# Altium footprint library IC.PCBLIB: 359 footprints (part 18 of 23)
Each footprint in its own frame and in the unit in brackets; x right, y up, seen from the top. Pads: shape width x height; smd on the part's side, far side on the other; paste and mask are expansions set on the pad; w line width, h text height; cw(c..) or ccw(c..) is an arc to the next point about the centre after c.
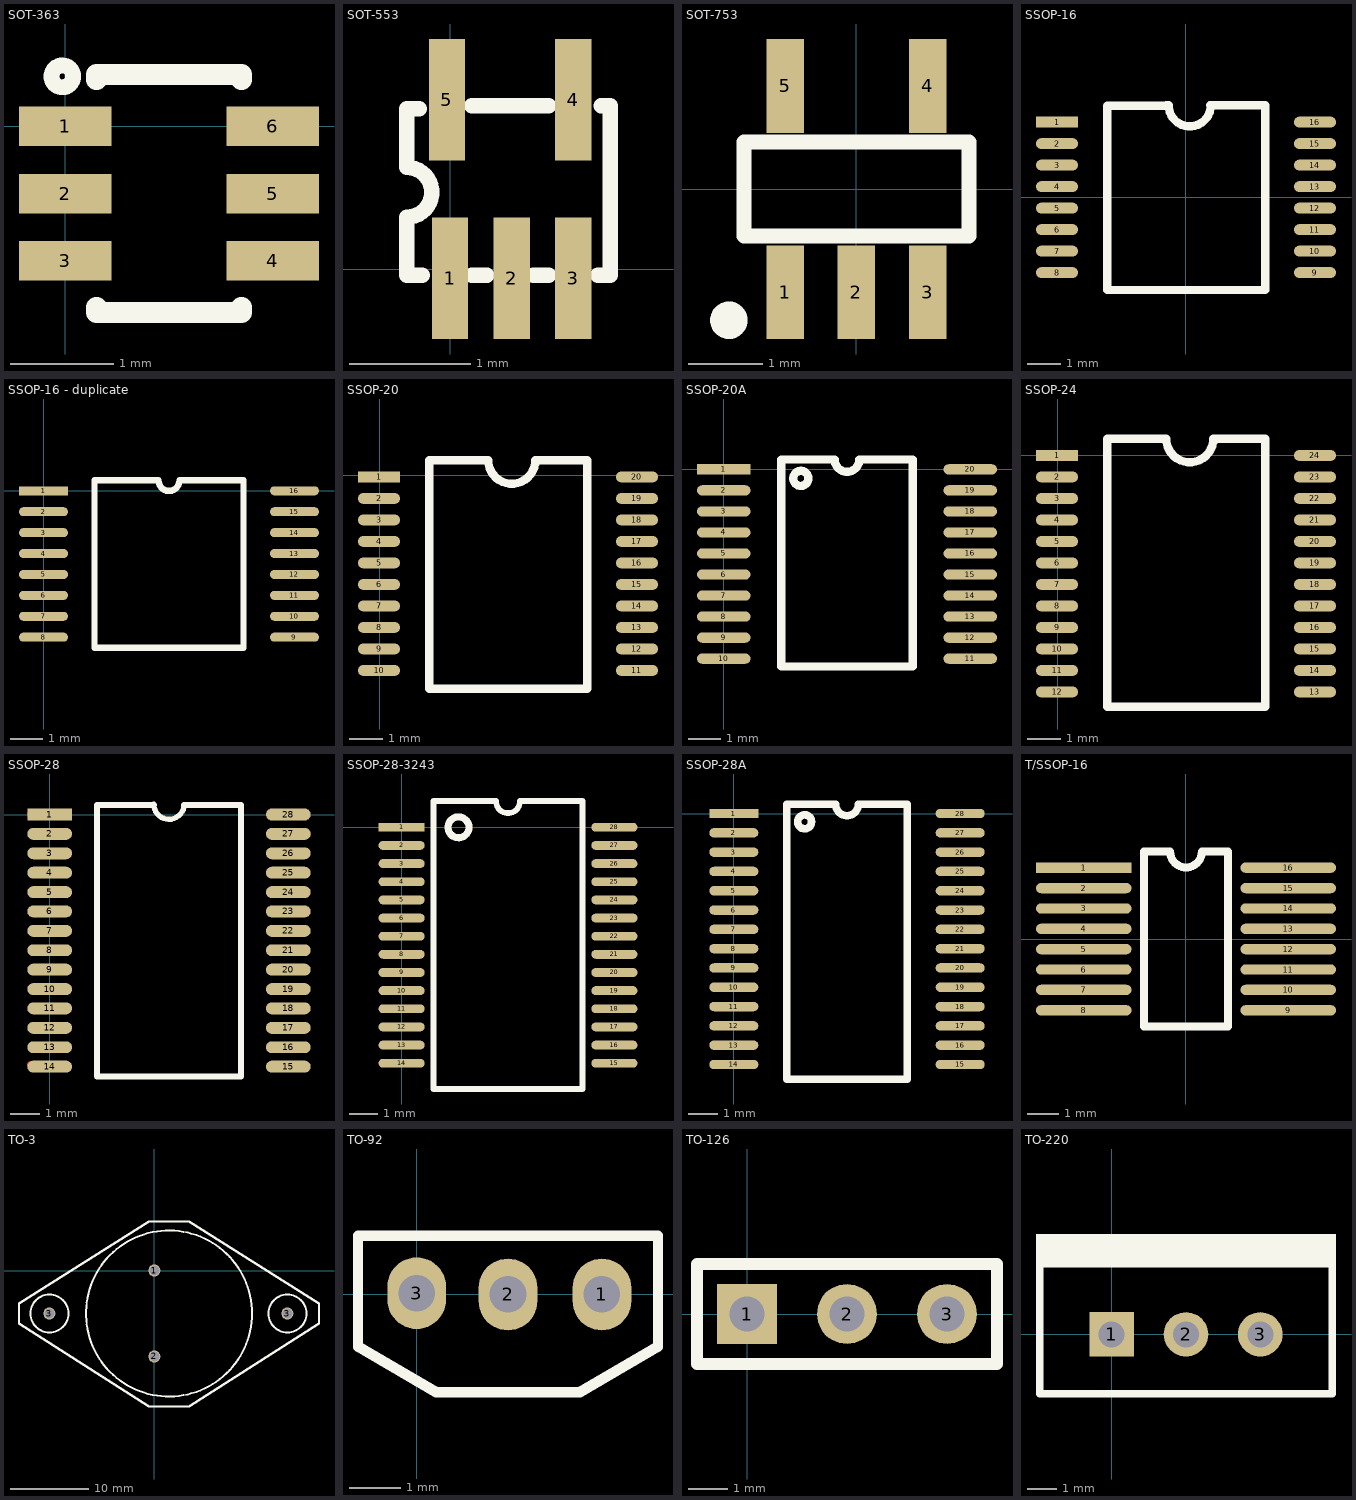
[diagram p17: the footprints below, top view; thin cyan lines are the x and y axes]

## SOT-363 [mil]
height 40
pads (6):
  rect 35.28x15 smd: 1(0,0) 2(0,-25.59) 3(0,-51.18) 4(78.9,-51.18) 5(78.9,-25.59) 6(78.9,0)
TopOverlay:
  circle w6: c-1.15,19 r4.15
  lines w7.87: 11.89,-68.9 11.89,-70.87 67.01,-70.87 67.01,-68.9 ; 11.89,17.72 11.89,19.68 67.01,19.68 67.01,17.72

## SOT-553 [mm]
pads (5):
  rect 0.3x1 smd: 1(0,-0.076) 2(0.508,-0.076) 3(1.016,-0.076) 4(1.016,1.397) 5(-0.025,1.397)
TopOverlay:
  lines w0.127: -0.254,1.321 -0.356,1.321 -0.356,0.838 cw(c-0.356,0.633) -0.356,0.429 -0.356,-0.051 -0.229,-0.051 ; 0.178,-0.051 0.305,-0.051 ; 0.178,1.346 0.813,1.346 ; 0.686,-0.051 0.813,-0.051 ; 1.219,-0.051 1.321,-0.051 1.321,1.346 1.245,1.346

## SOT-753 [mil]
pads (5):
  rect 20x50 smd: 1(-38,-55) 2(0,-55) 3(38,-55) 4(38,55) 5(-38,55)
TopOverlay:
  circle w10: c-68,-70 r5
  lines w8: -60,-25 60,-25 60,25 -60,25 -60,-25

## SSOP-16 [mm]
pads (16):
  rect 1.27x0.33 smd: 1(-3.9,2.275)
  oval 1.27x0.33 smd: 2(-3.9,1.625) 3(-3.9,0.975) 4(-3.9,0.325) 5(-3.9,-0.325) 6(-3.9,-0.975) 7(-3.9,-1.625) 8(-3.9,-2.275) 9(3.9,-2.275) 10(3.9,-1.625) 11(3.9,-0.975) 12(3.9,-0.325) 13(3.9,0.325) 14(3.9,0.975) 15(3.9,1.625) 16(3.9,2.275)
TopOverlay:
  lines w0.254: -2.376,-2.8 -2.376,2.775 -0.606,2.775 -0.598,2.783 ; -2.325,-2.8 2.399,-2.8 2.399,2.775 2.391,2.783 0.725,2.783 ; -0.522,2.783 ccw(c0.113,2.783) 0.748,2.783

## SSOP-16 - duplicate [mil]
pads (16):
  rect 60x11 smd: 1(0,0)
  oval 60x11 smd: 2(0,-25.59) 3(0,-51.18) 4(0,-76.77) 5(0,-102.36) 6(0,-127.95) 7(0,-153.54) 8(0,-179.13) 9(307.09,-179.13) 10(307.09,-153.54) 11(307.09,-127.95) 12(307.09,-102.36) 13(307.09,-76.77) 14(307.09,-51.18) 15(307.09,-25.59) 16(307.09,0)
TopOverlay:
  lines w7.87: 62.4,-191.93 244.69,-191.93 244.69,12.8 166.42,12.8 cw(c153.54,12.8) 140.67,12.8 62.4,12.8 62.4,-191.93

## SSOP-20 [mm]
pads (20):
  rect 1.27x0.33 smd: 1(-0.025,-0.051)
  oval 1.27x0.33 smd: 2(-0.025,-0.701) 3(-0.025,-1.351) 4(-0.025,-2.001) 5(-0.025,-2.651) 6(-0.025,-3.301) 7(-0.025,-3.951) 8(-0.025,-4.601) 9(-0.025,-5.251) 10(-0.025,-5.901) 11(7.775,-5.901) 12(7.775,-5.251) 13(7.775,-4.601) 14(7.775,-3.951) 15(7.775,-3.301) 16(7.775,-2.651) 17(7.775,-2.001) 18(7.775,-1.351) 19(7.775,-0.701) 20(7.775,-0.051)
TopOverlay:
  lines w0.254: 6.223,-6.45 1.499,-6.45 1.499,0.449 3.269,0.449 3.277,0.457 ccw(c3.99,0.457) 4.703,0.457 6.266,0.457 6.274,0.449 6.274,-6.45

## SSOP-20A [mil]
pads (20):
  rect 65x12.5 smd: 1(0,0)
  oval 65x12.5 smd: 2(0,-25.59) 3(0,-51.18) 4(0,-76.77) 5(0,-102.36) 6(0,-127.95) 7(0,-153.54) 8(0,-179.13) 9(0,-204.72) 10(0,-230.31) 11(300,-230.31) 12(300,-204.72) 13(300,-179.13) 14(300,-153.54) 15(300,-127.95) 16(300,-102.36) 17(300,-76.77) 18(300,-51.18) 19(300,-25.59) 20(300,0)
TopOverlay:
  circle w10: c93.78,-11 r9.22
  lines w10: 70,-240 230,-240 230,12 165,12 cw(c150,12) 135,12 70,12 70,-240

## SSOP-24 [mm]
pads (24):
  rect 1.27x0.33 smd: 1(-0.025,0)
  oval 1.27x0.33 smd: 2(-0.025,-0.65) 3(-0.025,-1.3) 4(-0.025,-1.95) 5(-0.025,-2.6) 6(-0.025,-3.25) 7(-0.025,-3.9) 8(-0.025,-4.55) 9(-0.025,-5.2) 10(-0.025,-5.85) 11(-0.025,-6.5) 12(-0.025,-7.15) 13(7.775,-7.15) 14(7.775,-6.5) 15(7.775,-5.85) 16(7.775,-5.2) 17(7.775,-4.55) 18(7.775,-3.9) 19(7.775,-3.25) 20(7.775,-2.6) 21(7.775,-1.95) 22(7.775,-1.3) 23(7.775,-0.65) 24(7.775,0)
TopOverlay:
  lines w0.254: 6.223,-7.6 1.499,-7.6 1.499,0.5 3.269,0.5 3.277,0.508 ccw(c3.99,0.508) 4.703,0.508 6.266,0.508 6.274,0.5 6.274,-7.6

## SSOP-28 [mm]
pads (28):
  rect 1.5x0.4 smd: 1(0,0)
  oval 1.5x0.4 smd: 2(0,-0.65) 3(0,-1.3) 4(0,-1.95) 5(0,-2.6) 6(0,-3.25) 7(0,-3.9) 8(0,-4.55) 9(0,-5.2) 10(0,-5.85) 11(0,-6.5) 12(0,-7.15) 13(0,-7.8) 14(0,-8.45) 15(8,-8.45) 16(8,-7.8) 17(8,-7.15) 18(8,-6.5) 19(8,-5.85) 20(8,-5.2) 21(8,-4.55) 22(8,-3.9) 23(8,-3.25) 24(8,-2.6) 25(8,-1.95) 26(8,-1.3) 27(8,-0.65) 28(8,0)
TopLayer:
  lines w0.254: -0.635,-8.382 -0.567,-8.45 0,-8.45 ; -0.635,0 0,0 ; 8,-8.45 8.059,-8.509 8.509,-8.509 ; 8,-5.2 8.007,-5.207 ; 8,-0.65 8.621,-0.65 ; 8,0 8.509,0 ; 8,0 8.509,0 ; 8,0 7.747,0 8.509,0 ; 8,0 8.509,0
TopOverlay:
  lines w0.178: 3.492,0.347 ccw(c4,0.347) 4.508,0.332
  lines w0.2: 3.492,0.325 1.585,0.325 1.585,-8.775 6.415,-8.775 6.415,0.325 4.508,0.325

## SSOP-28-3243 [mil]
pads (28):
  rect 65x12.5 smd: 1(0,0)
  oval 65x12.5 smd: 2(0,-25.59) 3(0,-51.18) 4(0,-76.77) 5(0,-102.36) 6(0,-127.95) 7(0,-153.54) 8(0,-179.13) 9(0,-204.72) 10(0,-230.31) 11(0,-255.91) 12(0,-281.5) 13(0,-307.09) 14(0,-332.68) 15(300,-332.68) 16(300,-307.09) 17(300,-281.5) 18(300,-255.91) 19(300,-230.31) 20(300,-204.72) 21(300,-179.13) 22(300,-153.54) 23(300,-127.95) 24(300,-102.36) 25(300,-76.77) 26(300,-51.18) 27(300,-25.59) 28(300,0)
TopOverlay:
  circle w10: c80.22,0 r14.78
  lines w8: 45,-369 45,37 133,37 ccw(c150,37) 167,37 255,37 255,-369 45,-369

## SSOP-28A [mil]
pads (28):
  rect 65x12.5 smd: 1(0,0)
  oval 65x12.5 smd: 2(0,-25.59) 3(0,-51.18) 4(0,-76.77) 5(0,-102.36) 6(0,-127.95) 7(0,-153.54) 8(0,-179.13) 9(0,-204.72) 10(0,-230.31) 11(0,-255.91) 12(0,-281.5) 13(0,-307.09) 14(0,-332.68) 15(300,-332.68) 16(300,-307.09) 17(300,-281.5) 18(300,-255.91) 19(300,-230.31) 20(300,-204.72) 21(300,-179.13) 22(300,-153.54) 23(300,-127.95) 24(300,-102.36) 25(300,-76.77) 26(300,-51.18) 27(300,-25.59) 28(300,0)
TopOverlay:
  circle w10: c93.78,-11 r9.22
  lines w10: 70,-352 70,12 135,12 ccw(c150,12) 165,12 230,12 230,-352 70,-352

## T/SSOP-16 [mm]
height 15
pads (16):
  rect 3.048x0.33 smd: 1(-3.265,2.275)
  oval 3.048x0.33 smd: 2(-3.265,1.625) 3(-3.265,0.975) 4(-3.265,0.325) 5(-3.265,-0.325) 6(-3.265,-0.975) 7(-3.265,-1.625) 8(-3.265,-2.275) 9(3.265,-2.275) 10(3.265,-1.625) 11(3.265,-0.975) 12(3.265,-0.325) 13(3.265,0.325) 14(3.265,0.975) 15(3.265,1.625) 16(3.265,2.275)
TopOverlay:
  lines w0.254: -1.346,-2.794 1.346,-2.794 1.346,2.794 0.508,2.794 cw(c0,2.794) -0.508,2.794 -1.346,2.794 -1.346,-2.794

## TO-3 [mil]
pads (4):
  round 60 hole 50: 1(0,0) 2(0,-430) 3(-525,-215) 3(665,-215)
TopOverlay:
  circle w10: c-525,-215 r95
  circle w10: c665,-215 r95
  circle w10: c73,-215 r415
  lines w12: -677,-265 -677,-165 -27,245 173,245 823,-165 823,-265 173,-680 -27,-680 -677,-265

## TO-92 [mil]
pads (3):
  oval 45x55 hole 28: 1(142,0) 2(70,0) 3(0,1)
TopOverlay:
  lines w8: -45,-40 15,-75 125,-75 185,-40 185,45 -45,45 -45,-40

## TO-126 [mil]
pads (3):
  rect 60x60 hole 35: 1(0,0)
  round 60 hole 35: 2(100,0) 3(200,0)
TopOverlay:
  lines w12: -50,-50 250,-50 250,50 -50,50 -50,-50

## TO-220 [mil]
pads (3):
  rect 60x60 hole 35: 1(0,0)
  round 60 hole 35: 2(100,0) 3(200,0)
TopOverlay:
  rectangle: -102,95 302,135
  lines w10: -97,-80 -97,95 297,95 297,-80 -97,-80